# Altium footprint library Keyboard_parts.PcbLib: 52 footprints (part 3 of 4)
Each footprint in its own frame and in the unit in brackets; x right, y up, seen from the top. Pads: shape width x height; smd on the part's side, far side on the other; paste and mask are expansions set on the pad; w line width, h text height; cw(c..) or ccw(c..) is an arc to the next point about the centre after c.
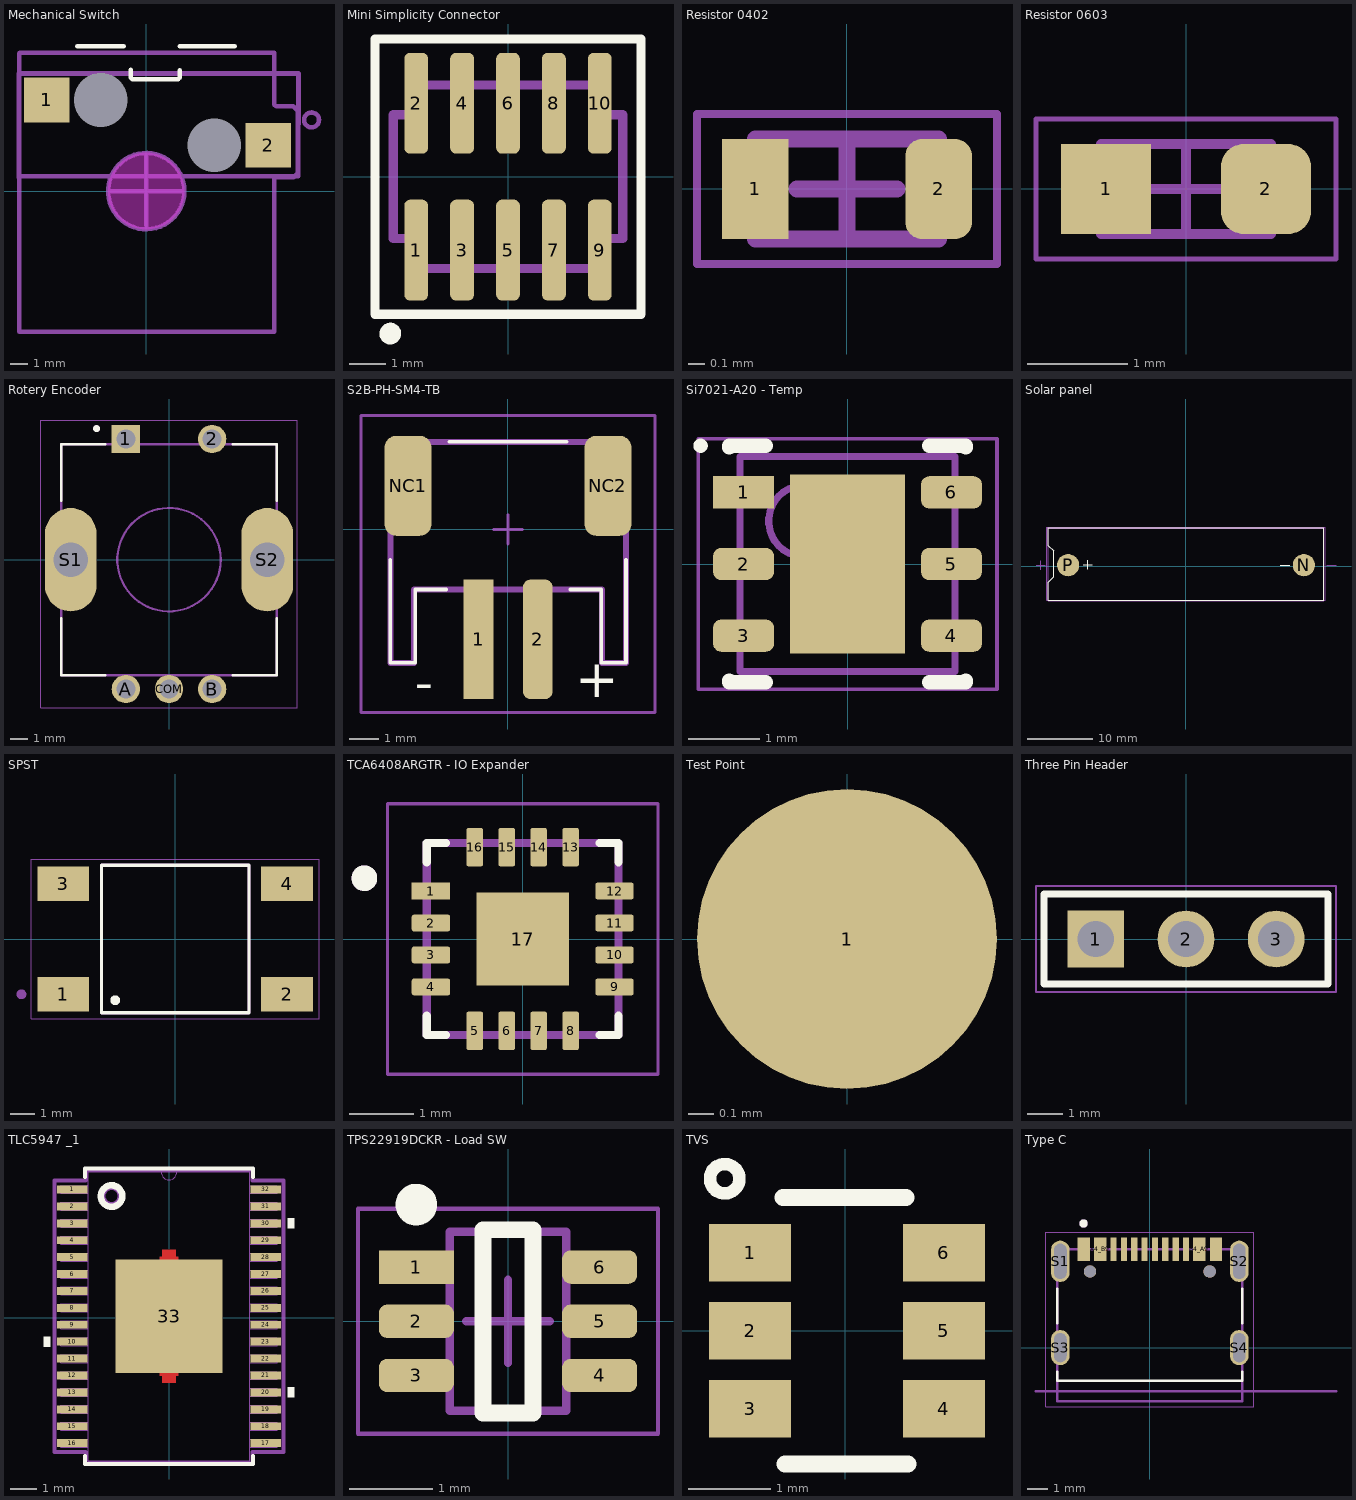
[diagram p2: the footprints below, top view; thin cyan lines are the x and y axes]

## Mechanical Switch [mm] "Compatible with any 3-Pin/5-Pin MX mechanical keyboard with SMD-LED light or RGB-SMD light."
pads (4):
  rect 2.55x2.5 smd: 1(-5.561,5.1) 2(6.831,2.56)
  round 0 hole 3 unplated: 4(3.81,2.56) 5(-2.54,5.1)
Top Overlay:
  lines w0.254: -3.861,8.103 -1.245,8.103 ; -0.864,6.802 -0.864,6.345 -0.787,6.268 1.803,6.268 1.88,6.345 1.88,6.751 ; 1.88,8.103 4.953,8.103
Keep-Out Layer:
  board cut-out: 0,-2.135 -0.21,-2.135 -0.623,-2.053 -1.011,-1.892 -1.361,-1.658 -1.658,-1.361 -1.892,-1.011 -2.053,-0.623 -2.135,-0.21 -2.135,0 -2.135,0.21 -2.053,0.623 -1.892,1.011 -1.658,1.361 -1.361,1.658 -1.011,1.892 -0.623,2.053 -0.21,2.135 0,2.135 0.21,2.135 0.623,2.053 1.011,1.892 1.361,1.658 1.658,1.361 1.892,1.011 2.053,0.623 2.135,0.21 2.135,0 2.135,-0.21 2.053,-0.623 1.892,-1.011 1.658,-1.361 1.361,-1.658 1.011,-1.892 0.623,-2.053 0.21,-2.135
Mechanical 13:
  circle w0.254: c9.246,3.982 r0.417
  lines w0.254: -7.087,-7.859 7.163,-7.859 7.163,0.777 8.255,0.777 8.484,1.005 8.484,4.485 8.23,4.739 7.264,4.739 7.163,4.841 7.163,7.736 -7.061,7.736 -7.087,7.711 -7.087,-7.859
  text ".Designator" at -6.947,-7.386 h1
Mechanical 15:
  circle w0.254: c0,0 r2.135
  lines w0.254: -7.112,0.762 -7.112,6.579 8.516,6.579 8.508,0.838 -7.112,0.838 ; -1.956,0 1.956,0 ; 0,-1.936 0,1.976
3D body "PG151101S11--3DModel-STEP-1.STEP": height 1.76, standoff -1.34, extent -6.666,0.91 7.834,6.8

## Mini Simplicity Connector [mil]
pads (10):
  rrect50% 26x110 smd mask+2: 1(-100,-80) 2(-100,80) 3(-50,-80) 4(-50,80) 5(0,-80) 6(0,80) 7(50,-80) 8(50,80) 9(100,-80) 10(100,80)
Top Overlay:
  lines w10: -145,-150 145,-150 145,150 -145,150 -145,-150
  lines w11.81: -122.39,-171.52 cw(c-128.27,-171.01) -122.37,-171.01
Mechanical 1:
  lines w10: -125,-67.5 -100,-67.5 -100,-100 100,-100 100,-67.5 125,-67.5 125,67.5 100,67.5 100,100 -100,100 -100,67.5 -125,67.5 -125,-67.5
  text ".Designator" at -97.68,-8.48 h19.68
3D body "FTSH-105-01-LM-DV-K.stp": height 240.75, standoff -0.25, extent -125.99,-115.99 124,114

## Resistor 0402 [mm]
height 0.55
pads (2):
  rect 0.4x0.6 smd: 1(-0.55,0)
  rrect50% 0.4x0.6 smd: 2(0.55,0)
Mechanical 13:
  lines w0.1: -0.55,-0.3 0.55,-0.3 0.55,0.3 -0.55,0.3 -0.55,-0.3
  text ".Designator" at -0.55,-0.3 h0.4
Mechanical 15:
  lines w0.05: -0.9,-0.45 0.9,-0.45 0.9,0.45 -0.9,0.45 -0.9,-0.45
  lines w0.1: -0.3,0 0.3,0 ; 0,-0.3 0,0.3
3D body: height 0.55, standoff 0, extent -0.55,-0.3 -0.05,0.3
3D body: height 0.55, standoff 0, extent 0.05,-0.3 0.55,0.3
3D body: height 0.55, standoff 0, extent -0.05,-0.3 0.05,0.3

## Resistor 0603 [mm] "Common footprint for 0603 resistor"
pads (2):
  rect 0.9x0.9 smd: 1(-0.8,0)
  rrect50% 0.9x0.9 smd: 2(0.8,0)
Mechanical 13:
  lines w0.1: -0.85,-0.45 0.85,-0.45 0.85,0.45 -0.85,0.45 -0.85,-0.45
  text ".Designator" at -0.635,-0.254 h0.4
Mechanical 15:
  lines w0.05: -1.5,-0.7 1.5,-0.7 1.5,0.7 -1.5,0.7 -1.5,-0.7
  lines w0.1: -0.45,0 0.45,0 ; 0,-0.45 0,0.45
3D body "0603_1608X05N.step": height 0.45, standoff 0, extent -0.775,-0.425 0.775,0.425

## Rotery Encoder [mm]
pads (7):
  rect 1.65x1.65 hole 1.1: 1(-2.5,7)
  round 1.65 hole 1.1: 2(2.5,7) A(-2.5,-7.5) B(2.5,-7.5) COM(0,-7.5)
  oval 3x6 hole 2 square: S1(-5.7,0) S2(5.7,0)
Top Overlay:
  circle w0.2: c-4.2,7.6 r0.1
  lines w0.127: -6.25,-3.4 -6.25,-6.7 -3.7,-6.7 ; -6.25,3.4 -6.25,6.7 -3.7,6.7 ; 3.7,-6.7 6.25,-6.7 6.25,-3.4 ; 3.7,6.7 6.25,6.7 6.25,3.4
Mechanical 13:
  circle w0.127: c0,0 r3
  circle w0.2: c-4.2,7.6 r0.1
  lines w0.127: -6.25,-6.7 6.25,-6.7 6.25,6.7 -6.25,6.7 -6.25,-6.7
Mechanical 15:
  lines w0.05: -7.45,-8.6 -7.45,8.1 7.45,8.1 7.45,-8.6 -7.45,-8.6

## S2B-PH-SM4-TB [mil]
pads (4):
  rect 40x160 smd: 1(-39.44,-147.2)
  rrect50% 40x160 smd: 2(39.93,-147.2)
  rrect50% 63x134 smd: NC1(-133.93,58.46) NC2(133.93,58.46)
Top Overlay:
  lines w5: -157.55,-40.43 -157.55,-178.7 -124.09,-178.7 -124.09,-80.28 -82.68,-80.28 ; -78.74,117.46 78.74,117.46 ; 83.52,-80.28 124.93,-80.28 124.93,-178.7 157.93,-178.7 157.93,-40.43
  text "+" at 89.93,-241.54 h86.8
  text "-" at -125,-245 h86.8
Mechanical 13:
  lines w8: -157.55,-178.7 -157.55,117.46 157.93,117.46 157.93,-178.7 125.93,-178.7 125.93,-80.28 -126.06,-80.28 -126.06,-178.7 -157.55,-178.7
  text ".Designator" at -115,-10 h66.93
Mechanical 15:
  lines w3.94: -19.69,0 19.68,0 ; 0,-19.68 0,19.69 ; -196.85,-245 196.85,-245 196.85,152.48 -196.85,152.48 -196.85,-245
3D body "S2B-PH-SM4-TB.STEP": height 219.54, standoff -0.94, extent -156.09,-215.83 154.93,122.76

## Si7021-A20 - Temp [mm] "SON, 6-Leads, Body 3.00x3.00mm, Pitch 1.00mm, Thermal Pad 2.40x1.50mm, IPC Medium Density /  / Humidity, Temperature 0 ~ 100% RH I2C ±3% RH 18 s Surface Mount"
height 0.8
pads (7):
  rect 0.85x0.45 smd mask+0.07: 1(-1.45,1)
  rrect50% 0.85x0.45 smd mask+0.07: 2(-1.45,0) 3(-1.45,-1) 4(1.45,-1) 5(1.45,0) 6(1.45,1)
  rect 1.6x2.5 smd paste-1 mask+0.07: ""(0,0)
Top Overlay:
  circle w0.1: c-2.05,1.65 r0.05
  lines w0.2: -1.65,-1.625 -1.65,-1.65 -1.14,-1.65 ; -1.65,1.625 -1.65,1.65 -1.14,1.65 ; 1.14,-1.65 1.65,-1.65 1.65,-1.625 ; 1.14,1.65 1.65,1.65 1.65,1.625
Top Paste:
  rectangle: -0.813,-1.27 0.813,-0.152
  rectangle: -0.813,0.152 0.813,1.27
Mechanical 13:
  circle w0.1: c-0.6,0.6 r0.5
  lines w0.1: -1.5,-1.5 1.5,-1.5 1.5,1.5 -1.5,1.5 -1.5,-1.5
  text ".Designator" at -1.4,-1.067 h1
Mechanical 15:
  lines w0.05: -2.085,-1.75 2.085,-1.75 2.085,1.75 -2.085,1.75 -2.085,-1.75
  lines w0.1: -0.5,0 0.5,0 ; 0,-0.5 0,0.5
3D body "SON100P300X80_HS-7N Si7021-A20.step": height 0.8, standoff 0, extent -1.55,-1.5 1.55,1.5

## Solar panel [mm] "Monocrystalline Solar Cell 184 mW 4.15 V"
pads (2):
  round 3.4 smd: N(18.076,0.203) P(-17.924,0.203)
Top Overlay:
  lines w0.127: -15.635,0.254 -14.235,0.254 ; -14.935,-0.446 -14.935,0.954 ; 14.5,0.152 15.9,0.152 ; -20.924,-5.131 -20.924,-2.369 -20.142,-1.587 -20.142,2.374 -20.924,3.156 -20.924,5.918 21.076,5.918 21.076,3.156 21.076,-2.369 21.076,-5.131 -20.924,-5.131
Mechanical 13:
  lines w0.127: -22.824,0.203 -21.424,0.203 ; -22.124,-0.497 -22.124,0.903 ; 21.576,0.203 22.976,0.203 ; -20.924,-5.207 -20.924,5.842 21.076,5.842 21.076,-5.207 -20.924,-5.207
Mechanical 15:
  lines w0.05: -21.174,-5.156 -21.174,5.969 21.326,5.969 21.326,-5.156 -21.174,-5.156

## SPST [mm]
pads (4):
  rect 2.1x1.4 smd: 1(-4.55,-2.25) 2(4.55,-2.25) 3(-4.55,2.25) 4(4.55,2.25)
Top Overlay:
  circle w0.2: c-2.438,-2.489 r0.1
  lines w0.127: -3,-3 -3,3 3,3 3,-3 -3,-3
Mechanical 13:
  circle w0.2: c-6.25,-2.25 r0.1
  lines w0.127: -3,-3 3,-3 3,3 -3,3 -3,-3
Mechanical 15:
  lines w0.05: -5.85,-3.25 5.85,-3.25 5.85,3.25 -5.85,3.25 -5.85,-3.25
3D body "step_temp.STEP": height 4.4, standoff 0, extent -5,-3 5,3

## TCA6408ARGTR - IO Expander [mm] "IC XPNDR 400KHZ I2C SMBUS 16VQFN"
pads (17):
  rect 0.6x0.26 smd mask+0.07: 1(-1.435,0.75)
  rrect25% 0.6x0.26 smd mask+0.07: 2(-1.435,0.25) 3(-1.435,-0.25) 4(-1.435,-0.75) 9(1.435,-0.75) 10(1.435,-0.25) 11(1.435,0.25) 12(1.435,0.75)
  rrect25% 0.26x0.6 smd mask+0.07: 5(-0.75,-1.435) 6(-0.25,-1.435) 7(0.25,-1.435) 8(0.75,-1.435) 13(0.75,1.435) 14(0.25,1.435) 15(-0.25,1.435) 16(-0.75,1.435)
  rect 1.45x1.45 smd paste-0.04 mask+0.07: 17(0,0)
Top Overlay:
  circle w0.2: c-2.475,0.95 r0.1
  lines w0.127: -1.5,-1.2 -1.5,-1.5 -1.2,-1.5 ; -1.5,1.2 -1.5,1.5 -1.2,1.5 ; 1.2,-1.5 1.5,-1.5 1.5,-1.2 ; 1.2,1.5 1.5,1.5 1.5,1.2
Mechanical 13:
  circle w0.2: c-2.475,0.95 r0.1
  lines w0.127: -1.5,-1.5 -1.5,1.5 1.5,1.5 1.5,-1.5 -1.5,-1.5
  text ".Designator" at -1.4,-1.233 h0.5
Mechanical 15:
  lines w0.05: -2.115,-2.115 -2.115,2.115 2.115,2.115 2.115,-2.115 -2.115,-2.115
3D body "step_temp.STEP": height 1, standoff 0, extent -1.5,-1.5 1.5,1.5

## Test Point [mm]
pads (1):
  round 1.2 smd paste-2539.97: 1(0,0)

## Three Pin Header [mm]
pads (3):
  rect 1.6x1.6 hole 1.02: 1(-2.54,0)
  round 1.6 hole 1.02: 2(0,0) 3(2.54,0)
Top Overlay:
  lines w0.2: -4,-1.27 4,-1.27 4,1.27 -4,1.27 -4,-1.27
Mechanical 13:
  lines w0.1: -4,-1.27 4,-1.27 4,1.27 -4,1.27 -4,-1.27
  text ".Designator" at -1.524,-0.635 h1.3
Mechanical 15:
  lines w0.05: -4.225,-1.495 4.225,-1.495 4.225,1.495 -4.225,1.495 -4.225,-1.495
  lines w0.1: -0.5,0 0.5,0 ; 0,-0.5 0,0.5
3D body "User Library-Header_Male_3Pin.STEP": height 8.54, standoff -3, extent -3.81,-1.27 3.81,1.22

## TLC5947 _1 [mil] "LED Driver IC 24 Output Linear Shift Register Dimming 30mA 32-HTSSOP"
pads (33):
  rect 46x12 smd paste+0 mask+0: 1(-146.5,193.93) 2(-146.5,168.34) 3(-146.5,142.75) 4(-146.5,117.16) 5(-146.5,91.57) 6(-146.5,65.98) 7(-146.5,40.39) 8(-146.5,14.8) 9(-146.5,-10.8) 10(-146.5,-36.39) 11(-146.5,-61.98) 12(-146.5,-87.57) 13(-146.5,-113.16) 14(-146.5,-138.75) 15(-146.5,-164.34) 16(-146.5,-189.93) 17(146.5,-189.93) 18(146.5,-164.34) 19(146.5,-138.75) 20(146.5,-113.16) 21(146.5,-87.57) 22(146.5,-61.98) 23(146.5,-36.39) 24(146.5,-10.8) 25(146.5,14.8) 26(146.5,40.39) 27(146.5,65.98) 28(146.5,91.57) 29(146.5,117.16) 30(146.5,142.75) 31(146.5,168.34) 32(146.5,193.93)
  rect 161.81x171.65 smd paste-433.07 mask+0: 33(0,2)
Top Layer:
  region: 13.78,87.83 -13.78,87.83 -13.78,91.76 -9.84,91.76 -9.84,102.39 9.84,102.39 9.84,91.76 13.78,91.76
  region: 13.78,-83.83 -13.78,-83.83 -13.78,-87.76 -9.84,-87.76 -9.84,-98.39 9.84,-98.39 9.84,-87.76 13.78,-87.76
Top Overlay:
  circle w10: c-87,184 r16.28
  region: -179.5,-28.89 -189.5,-28.89 -189.5,-43.89 -179.5,-43.89
  region: 179.5,-105.66 189.5,-105.66 189.5,-120.66 179.5,-120.66
  region: 179.5,150.25 189.5,150.25 189.5,135.25 179.5,135.25
  lines w6: -127,-209.03 -127,-221.5 127,-221.5 127,-209.03 ; -127,213.03 -127,225.5 127,225.5 127,213.03
Top Paste:
  region: -30.91,83.89 -76.97,83.89 -76.97,34.55 -30.91,34.55
  region: -30.91,26.67 -76.97,26.67 -76.97,-22.67 -30.91,-22.67
  region: -30.91,-30.55 -76.97,-30.55 -76.97,-79.89 -30.91,-79.89
  region: 23.03,83.89 -23.03,83.89 -23.03,34.55 23.03,34.55
  region: 23.03,26.67 -23.03,26.67 -23.03,-22.67 23.03,-22.67
  region: 23.03,-30.55 -23.03,-30.55 -23.03,-79.89 23.03,-79.89
  region: 76.97,83.89 30.91,83.89 30.91,34.55 76.97,34.55
  region: 76.97,26.67 30.91,26.67 30.91,-22.67 76.97,-22.67
  region: 76.97,-30.55 30.91,-30.55 30.91,-79.89 76.97,-79.89
Top Solder:
  region: 13.78,87.83 -13.78,87.83 -13.78,91.76 -9.84,91.76 -9.84,102.39 9.84,102.39 9.84,91.76 13.78,91.76
  region: 13.78,-83.83 -13.78,-83.83 -13.78,-87.76 -9.84,-87.76 -9.84,-98.39 9.84,-98.39 9.84,-87.76 13.78,-87.76
Mechanical 13:
  circle w10: c-87,184 r14.21
  lines w0: -12,220.5 ccw(c0,220.5) 12,220.5
  lines w1: -163.5,-195.93 -163.5,-183.93 -122,-183.93 -122,-195.93 -163.5,-195.93 ; -163.5,-170.34 -163.5,-158.34 -122,-158.34 -122,-170.34 -163.5,-170.34 ; -163.5,-144.75 -163.5,-132.75 -122,-132.75 -122,-144.75 -163.5,-144.75 ; -163.5,-119.16 -163.5,-107.16 -122,-107.16 -122,-119.16 -163.5,-119.16 ; -163.5,-93.57 -163.5,-81.57 -122,-81.57 -122,-93.57 -163.5,-93.57 ; -163.5,-67.98 -163.5,-55.98 -122,-55.98 -122,-67.98 -163.5,-67.98 ; -163.5,-42.39 -163.5,-30.39 -122,-30.39 -122,-42.39 -163.5,-42.39 ; -163.5,-16.8 -163.5,-4.8 -122,-4.8 -122,-16.8 -163.5,-16.8 ; -163.5,8.8 -163.5,20.8 -122,20.8 -122,8.8 -163.5,8.8 ; -163.5,34.39 -163.5,46.39 -122,46.39 -122,34.39 -163.5,34.39 ; -163.5,59.98 -163.5,71.98 -122,71.98 -122,59.98 -163.5,59.98 ; -163.5,85.57 -163.5,97.57 -122,97.57 -122,85.57 -163.5,85.57 ; -163.5,111.16 -163.5,123.16 -122,123.16 -122,111.16 -163.5,111.16 ; -163.5,136.75 -163.5,148.75 -122,148.75 -122,136.75 -163.5,136.75 ; -163.5,162.34 -163.5,174.34 -122,174.34 -122,162.34 -163.5,162.34 ; -163.5,187.93 -163.5,199.93 -122,199.93 -122,187.93 -163.5,187.93 ; -122,-216.5 122,-216.5 122,220.5 -122,220.5 -122,-216.5 ; 122,-195.93 122,-183.93 163.5,-183.93 163.5,-195.93 122,-195.93 ; 122,-170.34 122,-158.34 163.5,-158.34 163.5,-170.34 122,-170.34 ; 122,-144.75 122,-132.75 163.5,-132.75 163.5,-144.75 122,-144.75 ; 122,-119.16 122,-107.16 163.5,-107.16 163.5,-119.16 122,-119.16 ; 122,-93.57 122,-81.57 163.5,-81.57 163.5,-93.57 122,-93.57 ; 122,-67.98 122,-55.98 163.5,-55.98 163.5,-67.98 122,-67.98 ; 122,-42.39 122,-30.39 163.5,-30.39 163.5,-42.39 122,-42.39 ; 122,-16.8 122,-4.8 163.5,-4.8 163.5,-16.8 122,-16.8 ; 122,8.8 122,20.8 163.5,20.8 163.5,8.8 122,8.8 ; 122,34.39 122,46.39 163.5,46.39 163.5,34.39 122,34.39 ; 122,59.98 122,71.98 163.5,71.98 163.5,59.98 122,59.98 ; 122,85.57 122,97.57 163.5,97.57 163.5,85.57 122,85.57 ; 122,111.16 122,123.16 163.5,123.16 163.5,111.16 122,111.16 ; 122,136.75 122,148.75 163.5,148.75 163.5,136.75 122,136.75 ; 122,162.34 122,174.34 163.5,174.34 163.5,162.34 122,162.34 ; 122,187.93 122,199.93 163.5,199.93 163.5,187.93 122,187.93
  text ".Designator" at -118.06,-202.07 h31.5
Mechanical 15:
  lines w3.94: -39,0 39,0 ; 0,-20 0,19
  lines w6: -173.5,-203.53 -173.5,207.53 -126,207.53 -126,224.5 126,224.5 126,207.53 173.5,207.53 173.5,-203.53 126,-203.53 126,-220.5 -126,-220.5 -126,-203.53 -173.5,-203.53
3D body "DAP32_4P36X4P11.step": height 67.09, standoff 0, extent -163.5,-216.5 163.5,220.5

## TPS22919DCKR - Load SW [mm] "Power Switch/Driver 1:1 N-Channel 1.5A SC-70-6, 5.5 V, 1.5 A, 90-mO Self-Protected Load Switch with Controlled Rise Time"
pads (6):
  rect 0.9x0.4 smd mask+0.07: 1(-1.1,0.65)
  rrect50% 0.9x0.4 smd mask+0.07: 2(-1.1,0) 3(-1.1,-0.65) 4(1.1,-0.65) 5(1.1,0) 6(1.1,0.65)
Top Overlay:
  circle w0.25: c-1.1,1.4 r0.125
  lines w0.2: -0.3,-1.1 -0.3,1.1 0.3,1.1 0.3,-1.1 -0.3,-1.1
Mechanical 13:
  lines w0.1: -0.7,-1.075 0.7,-1.075 0.7,1.075 -0.7,1.075 -0.7,-1.075
  text ".Designator" at -0.6,-0.808 h0.5
Mechanical 15:
  lines w0.05: -1.8,-1.35 1.8,-1.35 1.8,1.35 -1.8,1.35 -1.8,-1.35
  lines w0.1: -0.5,0 0.5,0 ; 0,-0.5 0,0.5
3D body "SOT65P200X110-6N.step": height 1.1, standoff 0, extent -1.2,-1.075 1.2,1.075

## TVS [mm]
pads (6):
  rect 1x0.7 smd mask+0.025: 1(-1.162,0.95) 2(-1.162,0) 3(-1.162,-0.95) 4(1.2,-0.95) 5(1.2,0) 6(1.2,0.95)
Top Overlay:
  circle w0.152: c-1.473,1.854 r0.18
  lines w0.203: -0.762,1.626 0.738,1.626 ; -0.738,-1.626 0.762,-1.626
3D body "TVS_IP4234CZ6,125.STEP": height 1.1, standoff 0, extent -1.369,-1.44 1.381,1.46

## Type C [mm]
pads (18):
  rect 0.6x1.14 smd mask+0.05: A1_B12(-3.2,4.75) A4_B9(-2.4,4.75) B1_A12(3.2,4.75) B4_A9(2.4,4.75)
  rect 0.3x1.14 smd mask+0.05: A5(-1.25,4.75) A6(-0.25,4.75) A7(0.25,4.75) A8(1.25,4.75) B5(1.75,4.75) B6(0.75,4.75) B7(-0.75,4.75) B8(-1.75,4.75)
  oval 0.9x2 hole 0.6 slot 1.7 at 90 deg: S1(-4.325,4.17) S2(4.325,4.17)
  oval 0.9x1.7 hole 0.6 slot 1.4 at 90 deg: S3(-4.325,0) S4(4.325,0)
  round 0.6 hole 0.6 unplated: ""(-2.89,3.68) ""(2.89,3.68)
Top Overlay:
  circle w0.2: c-3.2,6 r0.1
  lines w0.127: -4.47,-1.17 -4.47,-1.6 4.47,-1.6 4.47,-1.17 ; -4.47,1.17 -4.47,2.85 ; 4.47,1.17 4.47,2.85
Mechanical 1:
  region: 0,0
  region: 0,0
  region: 0,0
  region: 0,0
  region: 0,0
  region: 0,0
  region: 0,0
  region: 0,0
  region: 0,0
  region: 0,0
  region: 0,0
  region: 0,0
  region: 0,0
  region: 0,0
  region: 0,0
  region: 0,0
Mechanical 13:
  circle w0.2: c-3.2,6 r0.1
  lines w0.127: -5.5,-2.11 9,-2.11 ; -4.47,-2.6 4.47,-2.6 4.47,4.75 -4.47,4.75 -4.47,-2.6
  text "PCB EDGE" at 5.2,-1.9 h0.61
Mechanical 15:
  lines w0.05: -5.025,-2.85 -5.025,5.57 5.025,5.57 5.025,-2.85 -5.025,-2.85
3D body "step_temp.STEP": height 3.31, standoff -0.99, extent -4.47,-2.6 4.47,5.305